# Altium footprint library Intelliclone.PcbLib: 372 footprints (part 23 of 24)
Each footprint in its own frame and in the unit in brackets; x right, y up, seen from the top. Pads: shape width x height; smd on the part's side, far side on the other; paste and mask are expansions set on the pad; w line width, h text height; cw(c..) or ccw(c..) is an arc to the next point about the centre after c.
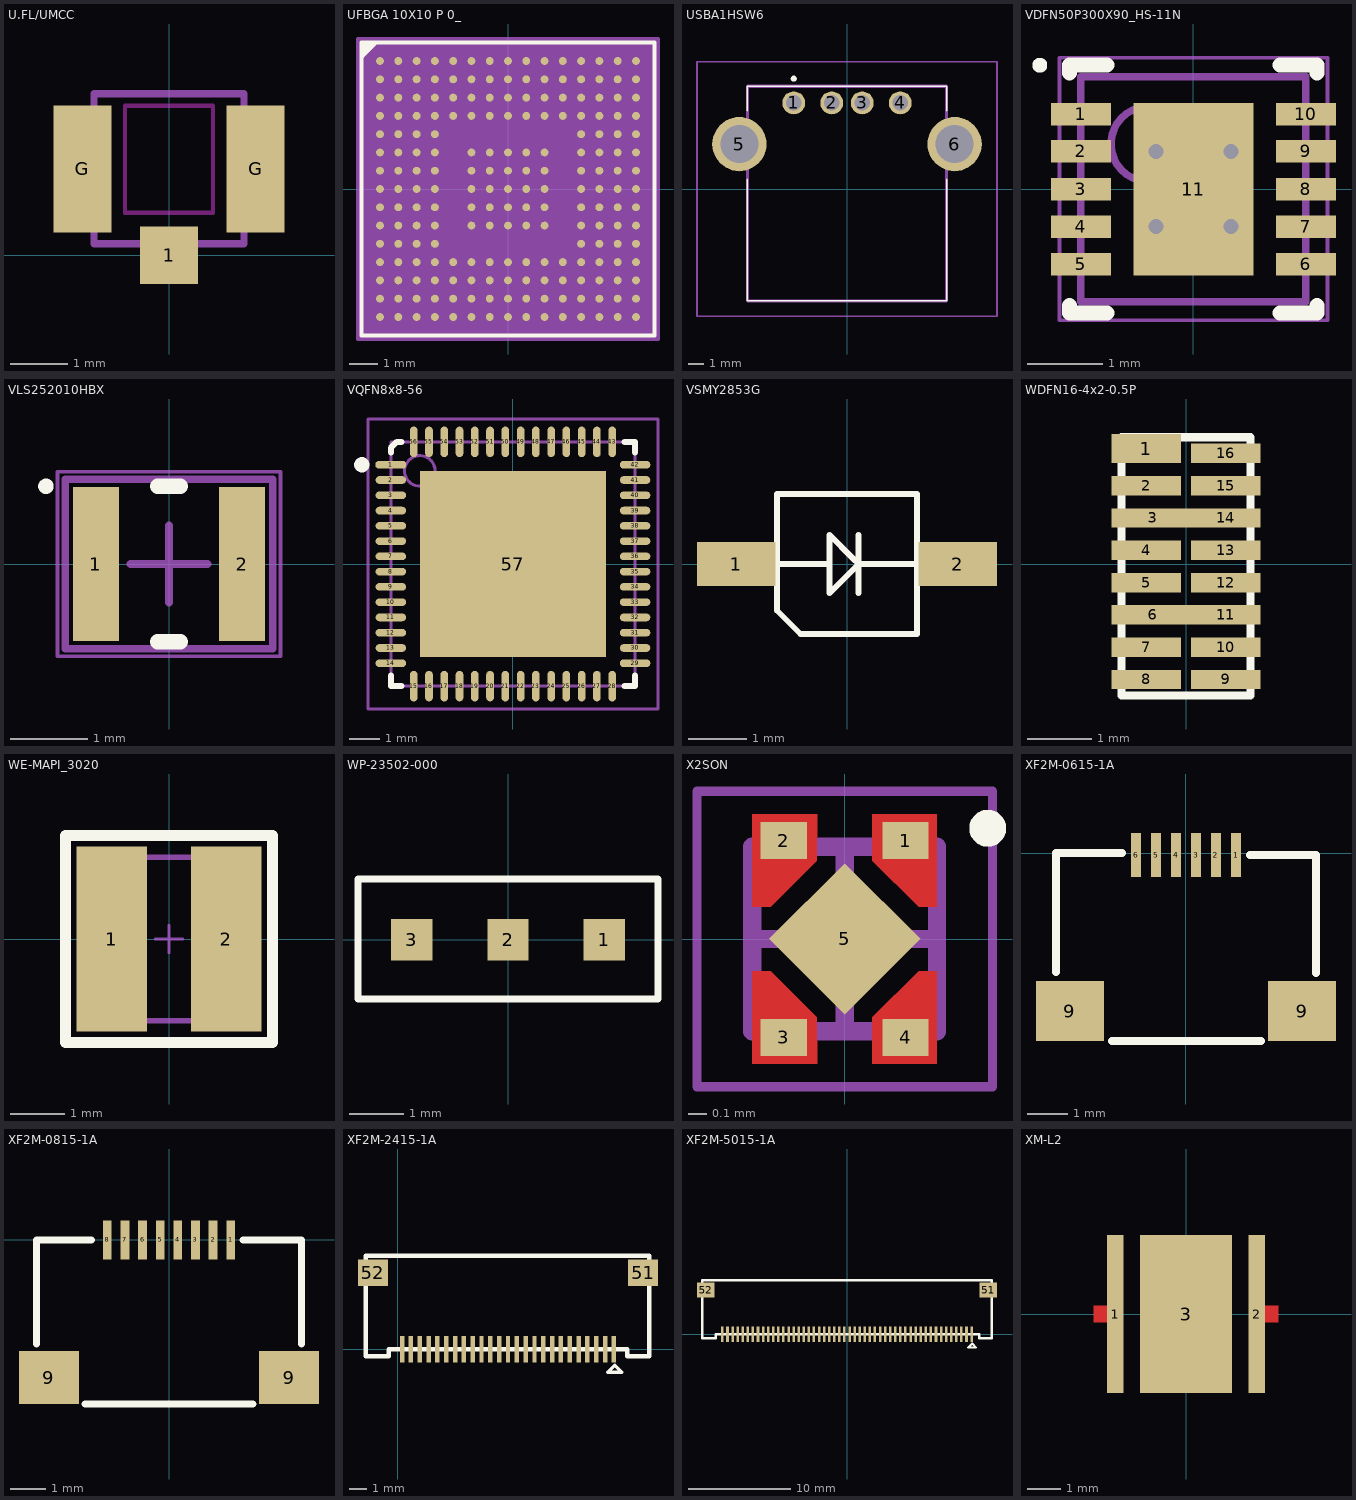
[diagram p22: the footprints below, top view; thin cyan lines are the x and y axes]

## U.FL/UMCC [mm] "Snap-on connector 6 GHz"
height 1.8
pads (3):
  rect 1x1 smd: 1(0,0)
  rect 1x2.2 smd: G(-1.5,1.5) G(1.5,1.5)
Top Layer keep-out:
  lines w0.076: -0.762,0.737 -0.762,2.591 0.762,2.591 0.762,0.737 -0.762,0.737
Mechanical 13:
  lines w0.127: -1.3,0.2 -1.3,2.8 1.3,2.8 1.3,0.2 -1.3,0.2
3D body "U.FL-R-SMT-1.stp": height 1.25, standoff 0, extent -1.524,-0.127 1.476,2.973

## UFBGA 10X10 P 0_ [mil]
pads (201):
  round 11 smd: A1(-179.13,179.13) A2(-153.54,179.13) A3(-127.95,179.13) A4(-102.36,179.13) A5(-76.77,179.13) A6(-51.18,179.13) A7(-25.59,179.13) A8(0,179.13) A9(25.59,179.13) A10(51.18,179.13) A11(76.77,179.13) A12(102.36,179.13) A13(127.95,179.13) A14(153.54,179.13) A15(179.13,179.13) B1(-179.13,153.54) B2(-153.54,153.54) B3(-127.95,153.54) B4(-102.36,153.54) B5(-76.77,153.54) B6(-51.18,153.54) B7(-25.59,153.54) B8(0,153.54) B9(25.59,153.54) B10(51.18,153.54) B11(76.77,153.54) B12(102.36,153.54) B13(127.95,153.54) B14(153.54,153.54) B15(179.13,153.54) C1(-179.13,127.95) C2(-153.54,127.95) C3(-127.95,127.95) C4(-102.36,127.95) C5(-76.77,127.95) C6(-51.18,127.95) C7(-25.59,127.95) C8(0,127.95) C9(25.59,127.95) C10(51.18,127.95) C11(76.77,127.95) C12(102.36,127.95) C13(127.95,127.95) C14(153.54,127.95) C15(179.13,127.95) D1(-179.13,102.36) D2(-153.54,102.36) D3(-127.95,102.36) D4(-102.36,102.36) D5(-76.77,102.36) D6(-51.18,102.36) D7(-25.59,102.36) D8(0,102.36) D9(25.59,102.36) D10(51.18,102.36) D11(76.77,102.36) D12(102.36,102.36) D13(127.95,102.36) D14(153.54,102.36) D15(179.13,102.36) E1(-179.13,76.77) E2(-153.54,76.77) E3(-127.95,76.77) E4(-102.36,76.77) E12(102.36,76.77) E13(127.95,76.77) E14(153.54,76.77) E15(179.13,76.77) F1(-179.13,51.18) F2(-153.54,51.18) F3(-127.95,51.18) F4(-102.36,51.18) F6(-51.18,51.18) F7(-25.59,51.18) F8(0,51.18) F9(25.59,51.18) F10(51.18,51.18) F12(102.36,51.18) F13(127.95,51.18) F14(153.54,51.18) F15(179.13,51.18) G1(-179.13,25.59) G2(-153.54,25.59) G3(-127.95,25.59) G4(-102.36,25.59) G6(-51.18,25.59) G7(-25.59,25.59) G8(0,25.59) G9(25.59,25.59) G10(51.18,25.59) G12(102.36,25.59) G13(127.95,25.59) G14(153.54,25.59) G15(179.13,25.59) H1(-179.13,0) H2(-153.54,0) H3(-127.95,0) H4(-102.36,0) H6(-51.18,0) H7(-25.59,0) H8(0,0) H9(25.59,0) H10(51.18,0) H12(102.36,0) H13(127.95,0) H14(153.54,0) H15(179.13,0) J1(-179.13,-25.59) J2(-153.54,-25.59) J3(-127.95,-25.59) J4(-102.36,-25.59) J6(-51.18,-25.59) J7(-25.59,-25.59) J8(0,-25.59) J9(25.59,-25.59) J10(51.18,-25.59) J12(102.36,-25.59) J13(127.95,-25.59) J14(153.54,-25.59) J15(179.13,-25.59) K1(-179.13,-51.18) K2(-153.54,-51.18) K3(-127.95,-51.18) K4(-102.36,-51.18) K6(-51.18,-51.18) K7(-25.59,-51.18) K8(0,-51.18) K9(25.59,-51.18) K10(51.18,-51.18) K12(102.36,-51.18) K13(127.95,-51.18) K14(153.54,-51.18) K15(179.13,-51.18) L1(-179.13,-76.77) L2(-153.54,-76.77) L3(-127.95,-76.77) L4(-102.36,-76.77) L12(102.36,-76.77) L13(127.95,-76.77) L14(153.54,-76.77) L15(179.13,-76.77) M1(-179.13,-102.36) M2(-153.54,-102.36) M3(-127.95,-102.36) M4(-102.36,-102.36) M5(-76.77,-102.36) M6(-51.18,-102.36) M7(-25.59,-102.36) M8(0,-102.36) M9(25.59,-102.36) M10(51.18,-102.36) M11(76.77,-102.36) M12(102.36,-102.36) M13(127.95,-102.36) M14(153.54,-102.36) M15(179.13,-102.36) N1(-179.13,-127.95) N2(-153.54,-127.95) N3(-127.95,-127.95) N4(-102.36,-127.95) N5(-76.77,-127.95) N6(-51.18,-127.95) N7(-25.59,-127.95) N8(0,-127.95) N9(25.59,-127.95) N10(51.18,-127.95) N11(76.77,-127.95) N12(102.36,-127.95) N13(127.95,-127.95) N14(153.54,-127.95) N15(179.13,-127.95) P1(-179.13,-153.54) P2(-153.54,-153.54) P3(-127.95,-153.54) P4(-102.36,-153.54) P5(-76.77,-153.54) P6(-51.18,-153.54) P7(-25.59,-153.54) P8(0,-153.54) P9(25.59,-153.54) P10(51.18,-153.54) P11(76.77,-153.54) P12(102.36,-153.54) P13(127.95,-153.54) P14(153.54,-153.54) P15(179.13,-153.54) R1(-179.13,-179.13) R2(-153.54,-179.13) R3(-127.95,-179.13) R4(-102.36,-179.13) R5(-76.77,-179.13) R6(-51.18,-179.13) R7(-25.59,-179.13) R8(0,-179.13) R9(25.59,-179.13) R10(51.18,-179.13) R11(76.77,-179.13) R12(102.36,-179.13) R13(127.95,-179.13) R14(153.54,-179.13) R15(179.13,-179.13)
Top Overlay:
  lines w6: -205,186 -204,186 -185,205 ; -205,193 -204,193 -192,205 -197,200 -205,200 ; -205,-205 -205,205 205,205 205,-205 -205,-205
Mechanical 13:
  lines w1: -200,187.2 -187.2,200 ; -200,-200 -200,200 200,200 200,-200 -200,-200
  text "1" at -179.13,215 h50
  text "A" at -240,180 h50
Mechanical 15:
  region: 210,-210 -210,-210 -210,210 210,210
  lines w6: -210,-210 210,-210 210,210 -210,210 -210,-210
3D body "UFBGA 10X10 P 0_.step": height 24.09, standoff 0, extent -199.99,-200 200.01,200
3D body: height 10, standoff 0, extent 0,0 10,10

## USBA1HSW6 [mm] "USB A connector"
pads (6):
  round 1.5 hole 1: 1(-3.5,5.66) 2(-1,5.66) 3(1,5.66) 4(3.5,5.66)
  round 3.57 hole 2.5: 5(-7.07,2.95) 6(7.07,2.95)
Top Overlay:
  lines w0.1: -6.55,0.65 -6.55,-7.35 6.55,-7.35 6.55,0.65 ; -6.55,5.15 -6.55,6.75 6.55,6.75 6.55,5.15
  lines w0.2: -3.6,7.25 ccw(c-3.5,7.25) -3.4,7.25 ccw(c-3.5,7.25) -3.6,7.25
Mechanical 15:
  lines w0.2: -6.55,-7.35 -6.55,6.75 6.55,6.75 6.55,-7.35 -6.55,-7.35
Mechanical 20:
  lines w0.1: -9.855,-8.35 -9.855,8.35 9.855,8.35 9.855,-8.35 -9.855,-8.35
3D body "femaleThruHoleUSB.stp": height 8.16, standoff -2.98, extent -7.885,-7.413 7.885,7.032

## VDFN50P300X90_HS-11N [mm] "VDFN, 10-Leads, Body 3.00x3.00mm, Pitch 0.50mm, Thermal Pad 2.30x1.60mm, IPC Medium Density"
height 0.9
pads (11):
  rect 0.8x0.3 smd: 1(-1.5,1) 2(-1.5,0.5) 3(-1.5,0) 4(-1.5,-0.5) 5(-1.5,-1) 6(1.5,-1) 7(1.5,-0.5) 8(1.5,0) 9(1.5,0.5) 10(1.5,1)
  rect 1.6x2.3 smd: 11(0,0)
via -0.5,0.5 diameter 0.5 hole 0.2
via 0.5,0.5 diameter 0.5 hole 0.2
via -0.5,-0.5 diameter 0.5 hole 0.2
via 0.5,-0.5 diameter 0.5 hole 0.2
Top Layer:
  pour cut-out: -0.79,1.147
Top Overlay:
  circle w0.1: c-2.05,1.65 r0.05
  lines w0.2: -1.65,-1.55 -1.65,-1.65 -1.155,-1.65 ; -1.65,1.55 -1.65,1.65 -1.155,1.65 ; 1.155,-1.65 1.65,-1.65 1.65,-1.55 ; 1.155,1.65 1.65,1.65 1.65,1.55
Mechanical 13:
  circle w0.1: c-0.6,0.6 r0.5
  lines w0.1: -1.5,-1.5 -1.5,1.5 1.5,1.5 1.5,-1.5 -1.5,-1.5
Mechanical 15:
  lines w0.05: -1.785,-1.75 -1.785,1.75 1.785,1.75 1.785,-1.75 -1.785,-1.75
  lines w0.1: -0.5,0 0.5,0 ; 0,-0.5 0,0.5
3D body "VDFN50P300X90_HS-11N.step": height 0.9, standoff 0, extent -1.5,-1.506 1.502,1.494

## VLS252010HBX [mm] "Chip Inductor, 2-Leads, Body 2.50x2.00mm, IPC Medium Density"
height 1
pads (2):
  rect 0.6x2 smd: 1(-0.95,0) 2(0.95,0)
Top Overlay:
  circle w0.1: c-1.6,1.01 r0.05
  lines w0.2: -0.15,-1.01 0.15,-1.01 ; -0.15,1.01 0.15,1.01
Mechanical 13:
  lines w0.1: -1.35,-1.1 1.35,-1.1 1.35,1.1 -1.35,1.1 -1.35,-1.1
Mechanical 15:
  lines w0.05: -1.45,-1.2 1.45,-1.2 1.45,1.2 -1.45,1.2 -1.45,-1.2
  lines w0.1: -0.5,0 0.5,0 ; 0,-0.5 0,0.5
3D body "vls252010hbx-1.step": height 0.99, standoff -0.01, extent -1.25,-1 1.25,1

## VQFN8x8-56 [mm] "VQFN, 56-Leads, Body 8.0x8.0mm, Pitch 0.50mm"
height 1
pads (57):
  oct 1x0.25 smd: 1(-4,3.25)
  oval 1x0.25 smd: 2(-4,2.75) 3(-4,2.25) 4(-4,1.75) 5(-4,1.25) 6(-4,0.75) 7(-4,0.25) 8(-4,-0.25) 9(-4,-0.75) 10(-4,-1.25) 11(-4,-1.75) 12(-4,-2.25) 13(-4,-2.75) 14(-4,-3.25) 29(4,-3.25) 30(4,-2.75) 31(4,-2.25) 32(4,-1.75) 33(4,-1.25) 34(4,-0.75) 35(4,-0.25) 36(4,0.25) 37(4,0.75) 38(4,1.25) 39(4,1.75) 40(4,2.25) 41(4,2.75) 42(4,3.25)
  oval 0.25x1 smd: 15(-3.25,-4) 16(-2.75,-4) 17(-2.25,-4) 18(-1.75,-4) 19(-1.25,-4) 20(-0.75,-4) 21(-0.25,-4) 22(0.25,-4) 23(0.75,-4) 24(1.25,-4) 25(1.75,-4) 26(2.25,-4) 27(2.75,-4) 28(3.25,-4) 43(3.25,4) 44(2.75,4) 45(2.25,4) 46(1.75,4) 47(1.25,4) 48(0.75,4) 49(0.25,4) 50(-0.25,4) 51(-0.75,4) 52(-1.25,4) 53(-1.75,4) 54(-2.25,4) 55(-2.75,4) 56(-3.25,4)
  rect 6.1x6.1 smd: 57(0,0)
Top Overlay:
  circle w0.25: c-4.95,3.25 r0.125
  lines w0.2: -4,-3.65 -4,-4 -3.65,-4 ; -4,3.65 -4,3.8 -3.8,4 -3.65,4 ; 3.65,-4 4,-4 4,-3.65 ; 3.65,4 4,4 4,3.65
Mechanical 13:
  circle w0.1: c-3.05,3.05 r0.5
  lines w0.1: -4,-4 4,-4 4,4 -4,4 -4,-4
Mechanical 15:
  lines w0.1: -0.5,0 0.5,0 ; 0,-0.5 0,0.5 ; -4.75,-4.75 4.75,-4.75 4.75,4.75 -4.75,4.75 -4.75,-4.75
3D body "QFN50P800X800X100_HS-57N.step": height 1, standoff 0, extent -4.05,-4.05 4.05,4.05

## VSMY2853G [mm] "Vishay LED"
height 2.55
pads (2):
  rect 1.35x0.75 smd: 1(-1.9,0) 2(1.9,0)
Top Overlay:
  lines w0.1: -1.2,0 -0.3,0 ; 0.2,-0.5 0.2,0.5 ; 1.2,0 0.2,0 ; -0.3,0 -0.3,-0.5 0.2,0 ; -0.3,0 -0.3,0.5 0.1,0.1 0.2,0 ; -1.2,-0.8 -1.2,1.2 1.2,1.2 1.2,-1.2 -0.8,-1.2 -1.2,-0.8
3D body "User Library-Vishay-VSMB2943GX01.STEP": height 2.6, standoff 0, extent -2.1,-1.15 2.1,1.15

## WDFN16-4x2-0.5P [mm]
pads (16):
  rect 1.07x0.45 smd: 1(-0.615,1.787)
  rect 1.07x0.3 smd: 2(-0.615,1.212) 4(-0.615,0.212) 5(-0.615,-0.288) 7(-0.615,-1.287) 8(-0.615,-1.787) 9(0.615,-1.787) 10(0.615,-1.287) 11(0.615,-0.787) 12(0.615,-0.288) 13(0.615,0.212) 14(0.615,0.712) 15(0.615,1.212) 16(0.615,1.712)
  rect 1.27x0.3 smd: 3(-0.515,0.712) 6(-0.515,-0.787)
Top Overlay:
  lines w0.127: -0.682,1.962 0.125,1.962 ; -1,-2.037 -1,1.962 1,1.962 1,-2.037 -1,-2.037

## WE-MAPI_3020 [mm]
height 2
pads (2):
  rect 1.3x3.4 smd: 1(-1.05,0) 2(1.05,0)
Top Overlay:
  lines w0.2: -1.9,-1.9 1.9,-1.9 1.9,1.9 -1.9,1.9 -1.9,-1.9
Mechanical 15:
  lines w0.1: -1.5,-1.5 1.5,-1.5 1.5,1.5 -1.5,1.5 -1.5,-1.5
Mechanical 19:
  lines w0.05: -0.25,0 0.25,0 ; 0,-0.25 0,0.25
3D body "STEP-WE-MAPI-3020-rev1.stp": height 2, standoff 0, extent -1.5,-1.5 1.5,1.5

## WP-23502-000 [mil]
pads (3):
  rect 30x30 smd: 1(70,0) 2(0,0) 3(-70,0)
Top Overlay:
  lines w5: -109,-43 -109,44 109,44 109,-43 -109,-43
3D body: height 157, standoff 0, extent -116.85,-43.31 101.11,43.65
3D body "WP-23502.STEP": height 157.09, standoff -27.13, extent -109.45,-42.72 109.45,44.29

## X2SON [mm] "XSON for TI LDO"
height 0.55
pads (5):
  rect 0.25x0.2 smd: 1(0.33,0.533) 2(-0.33,0.533) 3(-0.33,-0.533) 4(0.33,-0.533)
  rect 0.58x0.58 smd rot 45: 5(0,0)
Top Layer:
  region: 0.5,-0.675 0.5,-0.175 0.4,-0.175 0.15,-0.425 0.15,-0.675
  region: -0.5,-0.675 -0.5,-0.175 -0.4,-0.175 -0.15,-0.425 -0.15,-0.675
  region: 0.5,0.675 0.5,0.175 0.4,0.175 0.15,0.425 0.15,0.675
  region: -0.5,0.675 -0.5,0.175 -0.4,0.175 -0.15,0.425 -0.15,0.675
Top Overlay:
  circle w0.1: c0.775,0.6 r0.05
Mechanical 13:
  lines w0.1: -0.5,-0.5 -0.5,0.5 0.5,0.5 0.5,-0.5 -0.5,-0.5
Mechanical 15:
  lines w0.05: -0.8,-0.8 -0.8,0.8 0.8,0.8 0.8,-0.8 -0.8,-0.8
  lines w0.1: -0.5,0 0.5,0 ; 0,-0.5 0,0.5
3D body: height 0.4, standoff 0.05, extent -0.5,-0.5 0.5,0.5

## XF2M-0615-1A [mm] "CONN FPC 6POS 0.5MM SMD R/A"
pads (8):
  rect 0.25x1.1 smd: 1(1.25,-0.05) 2(0.75,-0.05) 3(0.25,-0.05) 4(-0.25,-0.05) 5(-0.75,-0.05) 6(-1.25,-0.05)
  rect 1.7x1.5 smd: 9(-2.9,-3.95) 9(2.9,-3.95)
Top Overlay:
  lines w0.2: -3.251,-2.975 -3.251,-0.025 ; -3.251,0 -1.6,0 ; -1.854,-4.699 1.875,-4.7 ; 1.6,-0.05 3.25,-0.05 3.25,-3
3D body "XF2M_0615_1A.step": height 2, standoff 0, extent -3.55,-4.95 3.55,0.95

## XF2M-0815-1A [mm] "CONN FPC 8POS 0.5MM SMD R/A"
pads (10):
  rect 0.25x1.1 smd: 1(1.75,0) 2(1.25,0) 3(0.75,0) 4(0.25,0) 5(-0.25,0) 6(-0.75,0) 7(-1.25,0) 8(-1.75,0)
  rect 1.7x1.5 smd: 9(-3.4,-3.9) 9(3.4,-3.9)
Top Overlay:
  lines w0.2: -3.75,-2.95 -3.75,0 -2.2,0 ; -2.375,-4.65 2.375,-4.65 ; 2.1,0 3.75,0 3.75,-2.95
3D body "xf2m-1015-1a.STEP": height 2, standoff 0, extent -4.55,-4.9 4.55,1

## XF2M-2415-1A [mm]
pads (27):
  rect 0.25x1.5 smd: 1(12.25,0) 2(11.75,0) 3(11.25,0) 4(10.75,0) 5(10.25,0) 6(9.75,0) 7(9.25,0) 8(8.75,0) 9(8.25,0) 10(7.75,0) 11(7.25,0) 12(6.75,0) 13(6.25,0) 14(5.75,0) 15(5.25,0) 16(4.75,0) 17(4.25,0) 18(3.75,0) 19(3.25,0) 20(2.75,0) 21(2.25,0) 22(1.75,0) 23(1.25,0) 24(0.75,0) 25(0.25,0)
  rect 1.7x1.5 smd: 51(13.9,4.35) 52(-1.4,4.35)
Top Overlay:
  lines w0.2: 11.9,-1.3 12.7,-1.3 12.3,-0.9 11.9,-1.3
  lines w0.254: -1.8,-0.4 -0.5,-0.4 -0.5,0 13,0 13,-0.4 14.25,-0.4 14.25,5.3 -1.8,5.3 -1.8,-0.4
3D body "XF2M_2415_1A.step": height 2.1, standoff 0.1, extent -1.85,-0.5 14.25,5.4

## XF2M-5015-1A [mm]
pads (52):
  rect 0.25x1.5 smd: 1(12.25,0) 2(11.75,0) 3(11.25,0) 4(10.75,0) 5(10.25,0) 6(9.75,0) 7(9.25,0) 8(8.75,0) 9(8.25,0) 10(7.75,0) 11(7.25,0) 12(6.75,0) 13(6.25,0) 14(5.75,0) 15(5.25,0) 16(4.75,0) 17(4.25,0) 18(3.75,0) 19(3.25,0) 20(2.75,0) 21(2.25,0) 22(1.75,0) 23(1.25,0) 24(0.75,0) 25(0.25,0) 26(-0.25,0) 27(-0.75,0) 28(-1.25,0) 29(-1.75,0) 30(-2.25,0) 31(-2.75,0) 32(-3.25,0) 33(-3.75,0) 34(-4.25,0) 35(-4.75,0) 36(-5.25,0) 37(-5.75,0) 38(-6.25,0) 39(-6.75,0) 40(-7.25,0) 41(-7.75,0) 42(-8.25,0) 43(-8.75,0) 44(-9.25,0) 45(-9.75,0) 46(-10.25,0) 47(-10.75,0) 48(-11.25,0) 49(-11.75,0) 50(-12.25,0)
  rect 1.7x1.5 smd: 51(13.9,4.35) 52(-13.9,4.35)
Top Overlay:
  lines w0.2: 11.9,-1.3 12.7,-1.3 12.3,-0.9 11.9,-1.3
  lines w0.254: -14.25,-0.4 -12.9,-0.4 -12.9,0 13,0 13,-0.4 14.25,-0.4 14.25,5.3 -14.25,5.3 -14.25,-0.4
3D body "XF2M_5015_1A.step": height 2, standoff 0, extent -14.575,-0.475 14.525,5.425

## XM-L2 [mm] "Cree XM LED package"
height 3
pads (3):
  rect 0.5x4.8 smd paste-0.1: 1(-2.15,0) 2(2.15,0)
  rect 2.782x4.8 smd paste-0.1: 3(0,0)
Top Layer:
  region: -2.8,0.25 -2.8,-0.25 -1.925,-0.25 -1.925,0.25
  region: 1.925,0.25 1.925,-0.25 2.8,-0.25 2.8,0.25
3D body "xlamp_xm-l.stp": height 2.99, standoff -0.03, extent -2.5,-2.5 2.5,2.5